# Altium footprint library self_pcblib v1.8.6.PcbLib: 164 footprints (part 11 of 11)
Each footprint in its own frame and in the unit in brackets; x right, y up, seen from the top. Pads: shape width x height; smd on the part's side, far side on the other; paste and mask are expansions set on the pad; w line width, h text height; cw(c..) or ccw(c..) is an arc to the next point about the centre after c.
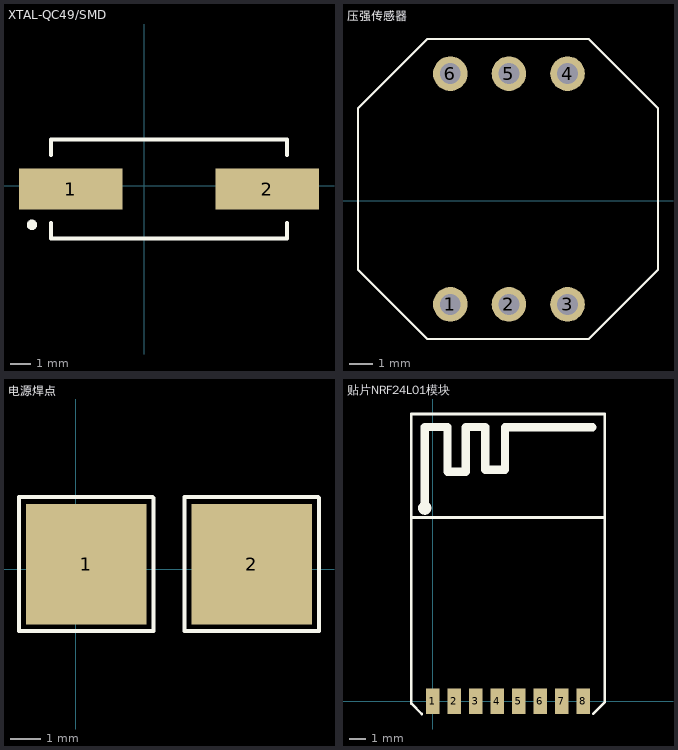
[diagram p10: the footprints below, top view; thin cyan lines are the x and y axes]

## XTAL-QC49/SMD [mm]
pads (2):
  rect 5x2 smd: 1(-3.556,-0.152) 2(5.944,-0.152)
Top Overlay:
  circle w0.25: c-5.431,-1.882 r0.125
  lines w0.2: -4.506,-1.802 -4.506,-2.552 6.894,-2.552 6.894,-1.802 ; -4.506,1.498 -4.506,2.248 6.894,2.248 6.894,1.498
3D body "XTAL-49S(1).step": height 4.31, standoff 0, extent -4.88,-2.544 7.42,2.286

## 压强传感器 [mm] "压强传感器接口"
pads (6):
  round 1.5 hole 0.9: 1(8,-4.5) 2(10.54,-4.5) 3(13.08,-4.5) 4(13.08,5.5) 5(10.54,5.5) 6(8,5.5)
Top Overlay:
  lines w0.103: 4,-3 7,-6 14,-6 17,-3 17,4 14,7 7,7 4,4 4,-3

## 电源焊点 [mm]
pads (2):
  rect 4x4 smd: 1(0.355,0.154) 2(5.855,0.154)
Top Overlay:
  lines w0.127: -1.88,-2.056 -1.88,2.389 2.565,2.389 2.591,2.364 2.591,-2.056 -1.88,-2.056 ; 3.62,-2.056 8.091,-2.056 8.091,2.364 8.065,2.389 3.62,2.389 3.62,-2.056
3D body "link_p.stp": height 0.1, standoff 0, extent -1.645,-1.846 2.355,2.154
3D body "link_p.stp": height 0.1, standoff 0, extent 3.855,-1.846 7.855,2.154

## 贴片NRF24L01模块 [mm]
pads (8):
  rect 0.8x1.5 smd: 1(0,0) 2(1.27,0) 3(2.54,0) 4(3.81,0) 5(5.08,0) 6(6.35,0) 7(7.62,0) 8(8.89,0)
Top Overlay:
  circle w0.254: c-0.483,11.43 r0.27
  lines w0.15: -1.194,10.871 10.16,10.871 ; -0.66,-0.762 -1.27,-0.152 -1.27,0 -1.27,17 10.16,17 10.16,0 10.16,-0.076 9.5,-0.737
  lines w0.5: -0.483,11.43 -0.483,16.231 0.864,16.231 0.864,13.589 1.956,13.589 1.956,16.205 1.981,16.231 3.099,16.231 3.099,13.691 4.267,13.691 4.267,16.205 9.449,16.205